# Altium footprint library Module.PcbLib: 57 footprints (part 3 of 4)
Each footprint in its own frame and in the unit in brackets; x right, y up, seen from the top. Pads: shape width x height; smd on the part's side, far side on the other; paste and mask are expansions set on the pad; w line width, h text height; cw(c..) or ccw(c..) is an arc to the next point about the centre after c.
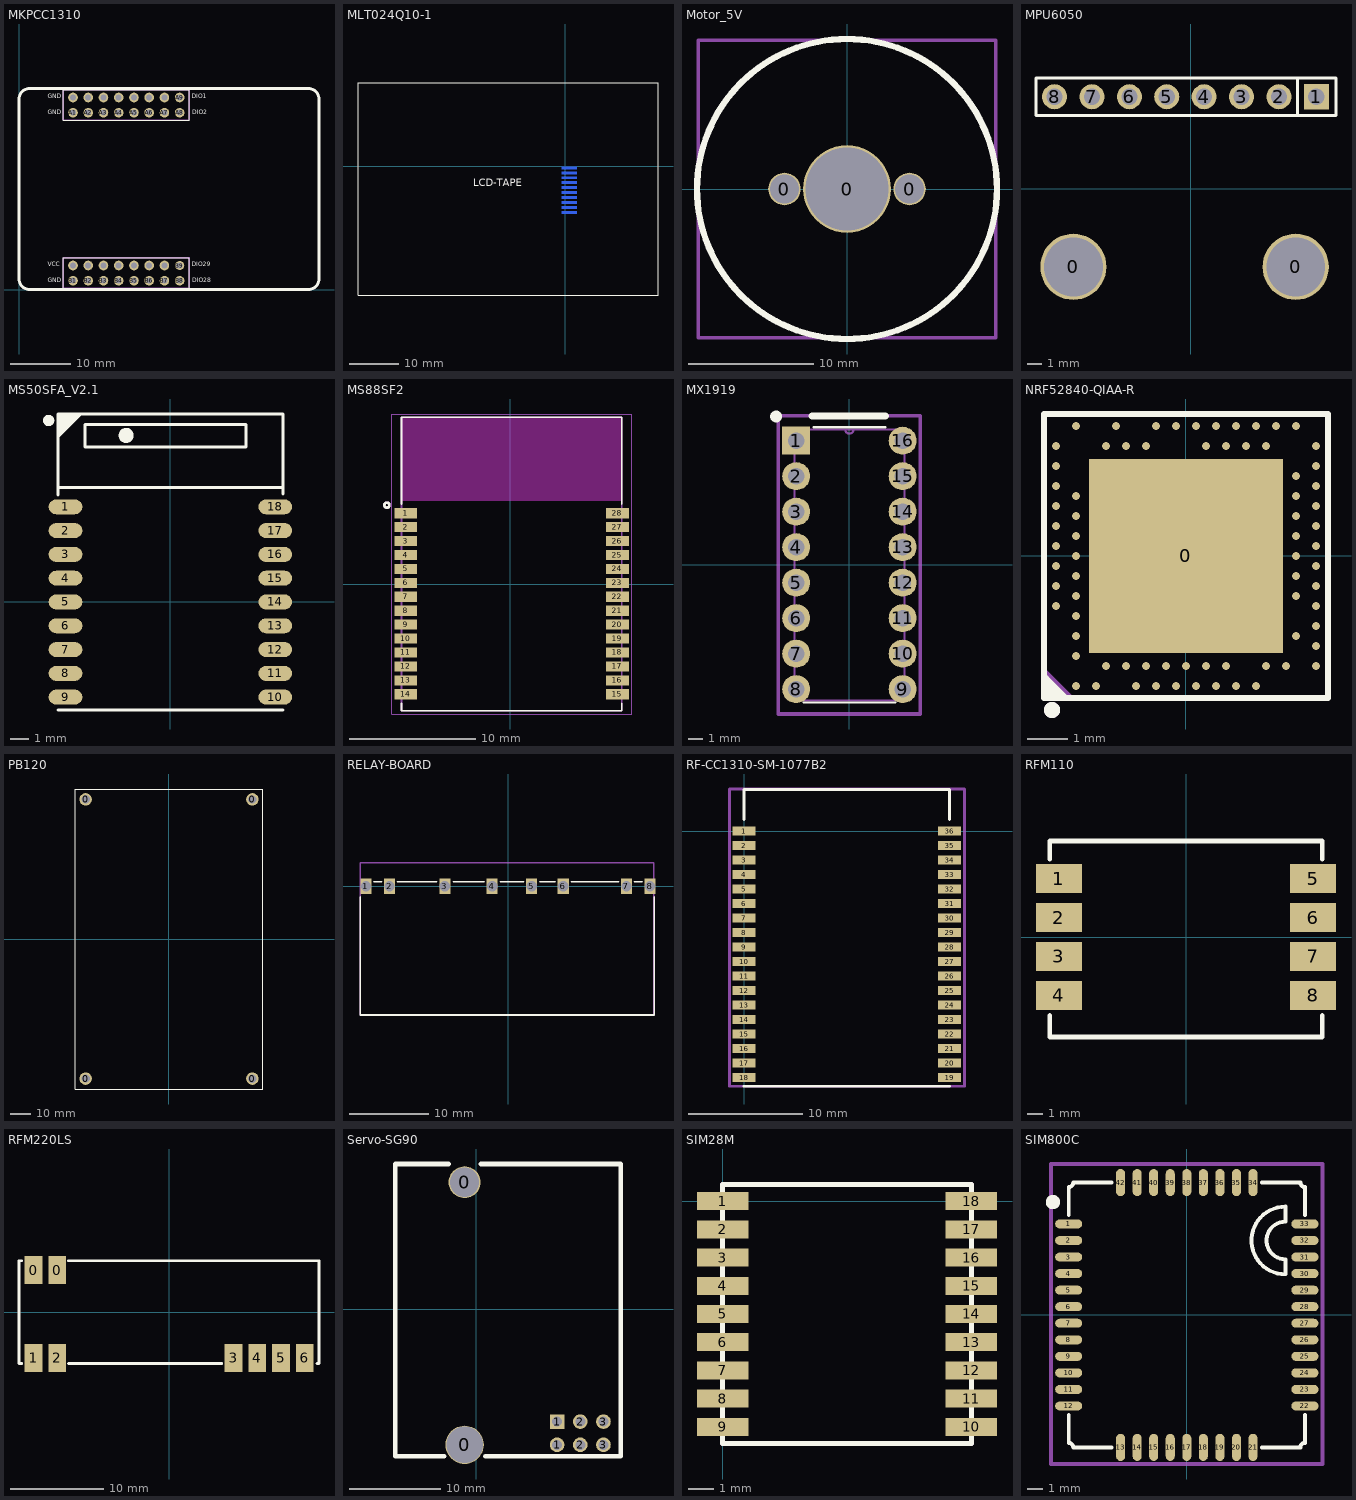
[diagram p2: the footprints below, top view; thin cyan lines are the x and y axes]

## MKPCC1310 [mm]
pads (32):
  round 1.6 hole 1: A1(9,29.46) A2(11.54,29.46) A3(14.08,29.46) A4(16.62,29.46) A5(19.16,29.46) A6(21.7,29.46) A7(24.24,29.46) A8(26.78,29.46) A9(26.78,32) A10(24.24,32) A11(21.7,32) A12(19.16,32) A13(16.62,32) A14(14.08,32) A15(11.54,32) A16(9,32) B1(9,1.46) B2(11.54,1.46) B3(14.08,1.46) B4(16.62,1.46) B5(19.16,1.46) B6(21.7,1.46) B7(24.24,1.46) B8(26.78,1.46) B10(24.24,4) B11(21.7,4) B12(19.16,4) B13(16.62,4) B14(14.08,4) B15(11.54,4) B16(9,4)
  round 1.524 hole 1.016: B9(26.78,4)
Top Overlay:
  lines w0.2: 7.39,0.19 28.39,0.19 28.39,5.27 12.81,5.27 7.39,5.27 7.39,0.19 ; 7.39,28.19 28.39,28.19 28.39,33.27 12.81,33.27 7.39,33.27 7.39,28.19
  lines w0.5: 0,1.75 ccw(c1.75,1.75) 1.75,0 48.25,0 ccw(c48.25,1.75) 50,1.75 50,31.75 ccw(c48.25,31.75) 48.25,33.5 1.75,33.5 ccw(c1.75,31.75) 0,31.75 0,1.75
  text "DIO1" at 28.8,31.6 h1.2
  text "DIO2" at 28.9,29 h1.2
  text "GND" at 4.8,1 h1.2
  text "VCC" at 4.8,3.6 h1.2
  text "DIO28" at 28.9,1 h1.2
  text "DIO29" at 28.8,3.6 h1.2
  text "GND" at 4.8,31.6 h1.2
  text "GND" at 4.8,29 h1.2
Mechanical 13:
  lines w0.254: 7.39,0.19 28.39,0.19 28.39,5.27 7.39,5.27 7.39,0.19 ; 7.39,28.19 28.39,28.19 28.39,33.27 7.39,33.27 7.39,28.19
  text ".Designator" at 15.5,19.3 h1.5
Mechanical 15:
  lines w0.254: 7.39,0.19 28.39,0.19 28.39,5.27 7.39,5.27 7.39,0.19 ; 7.39,28.19 28.39,28.19 28.39,33.27 7.39,33.27 7.39,28.19
  text ".Comment" at 15.5,19.3 h1.5
3D body "ESW-108-12-G-D.stp": height 11.01, standoff -2.33, extent 7.476,0.19 28.304,5.27
3D body "ESW-108-12-G-D.stp": height 11.01, standoff -2.33, extent 7.476,28.19 28.304,33.27
3D body "Module_RF_CC1310_433MHz_v2.1.step": height 19.45, standoff 5.13, extent 0,0 50,33.5

## MLT024Q10-1 [mm]
pads (10):
  rect 3x0.5 smd far side: 1(0.849,-0.312) 2(0.849,-1.312) 3(0.849,-2.312) 4(0.849,-3.312) 5(0.849,-4.312) 6(0.849,-5.312) 7(0.849,-6.312) 8(0.849,-7.312) 9(0.849,-8.312) 10(0.849,-9.312)
Top Overlay:
  lines w0.2: -41.648,-25.936 -41.648,16.784 18.692,16.784 18.692,-25.936 -41.648,-25.936
  text "LCD-TAPE" at -18.478,-4.548 h2.5
3D body "Màn hình 4 (1).STEP": height 2.25, standoff -3.3, extent -41.648,-26.136 18.692,16.584

## Motor_5V [mm]
pads (3):
  round 2.6 hole 2.3: 0(-5,0) 0(5,0)
  round 7 hole 6.6: 0(0,0)
Top Overlay:
  lines w0.5: -12,0 cw(c0,0) 0,12 cw(c0,0) 12,0 cw(c0,0) 0,-12 cw(c0,0) -12,0
Mechanical 13:
  lines w0.254: -11.9,-11.9 -11.9,11.9 11.9,11.9 11.9,-11.9 -11.9,-11.9
Mechanical 15:
  lines w0.254: -11.9,-11.9 -11.9,11.9 11.9,11.9 11.9,-11.9 -11.9,-11.9
3D body "Motor_3D.step": height 0.25, standoff -0.41, extent -12.001,-12.001 12.001,12.001
3D body "User Library-3v 5240rpm motor assem.STEP": height 5.43, standoff -37.57, extent -11.9,-11.9 11.9,11.9

## MPU6050 [mm]
pads (10):
  round 4.5 hole 4: 0(-7.96,-5.3) 0(7.14,-5.3)
  rect 1.7x1.7 hole 1.1: 1(8.54,6.25)
  round 1.7 hole 1.1: 2(6,6.25) 3(3.46,6.25) 4(0.92,6.25) 5(-1.62,6.25) 6(-4.16,6.25) 7(-6.7,6.25) 8(-9.24,6.25)
Top Overlay:
  lines w0.2: 7.27,4.98 7.27,7.52 ; -10.5,4.98 -10.5,7.52 9.875,7.52 9.875,4.98 -10.5,4.98
3D body "MPU6050 With Mounting Hardware.step": height 15.07, standoff -2.77, extent -10.504,-7.75 9.875,7.5

## MS50SFA_V2.1 [mm] "MS50SFA"
pads (18):
  oval 1.8x0.8 smd: 1(-5.6,5.08) 2(-5.6,3.81) 3(-5.6,2.54) 4(-5.6,1.27) 5(-5.6,0) 6(-5.6,-1.27) 7(-5.6,-2.54) 8(-5.6,-3.81) 9(-5.6,-5.08) 10(5.6,-5.08) 11(5.6,-3.81) 12(5.6,-2.54) 13(5.6,-1.27) 14(5.6,0) 15(5.6,1.27) 16(5.6,2.54) 17(5.6,3.81) 18(5.6,5.08)
Top Overlay:
  circle w0.4: c-2.36,8.89 r0.2
  circle w0.3: c-6.5,9.69 r0.15
  region: -5.995,9.255 -5.995,10.035 -5.96,10.035 -5.935,10.035 -4.695,10.035 -5.995,8.735
  lines w0.16: -6,-5.776 6,-5.776 ; -6,5.704 -6,10.024 6,10.024 6,5.774 ; -6,6.124 6,6.124 ; 4.03,8.274 -4.55,8.274 -4.55,9.474 4.03,9.474 ; 4.04,8.274 4.04,9.474
Mechanical 15:
  text "Chip Antenna" at -4.16,8.58 h0.5
3D body "MS50SFA_PCB_V2.1.step": height 2.03, standoff 0.01, extent -5.99,-5.86 6.01,10

## MS88SF2 [mm]
pads (28):
  rect 1.8x0.8 smd: 1(-8.26,5.61) 2(-8.26,4.51) 3(-8.26,3.41) 4(-8.26,2.31) 5(-8.26,1.21) 6(-8.26,0.11) 7(-8.26,-0.99) 8(-8.26,-2.09) 9(-8.26,-3.19) 10(-8.26,-4.29) 11(-8.26,-5.39) 12(-8.26,-6.49) 13(-8.26,-7.59) 14(-8.26,-8.69) 15(8.46,-8.69) 16(8.46,-7.59) 17(8.46,-6.49) 18(8.46,-5.39) 19(8.46,-4.29) 20(8.46,-3.19) 21(8.46,-2.09) 22(8.46,-0.99) 23(8.46,0.11) 24(8.46,1.21) 25(8.46,2.31) 26(8.46,3.41) 27(8.46,4.51) 28(8.46,5.61)
Top Overlay:
  circle w0.2: c-9.75,6.25 r0.2
  lines w0.127: -8.6,-9.395 -8.6,-10 8.8,-10 8.8,-9.395 ; -8.6,6.315 -8.6,13.2 8.8,13.2 8.8,6.315
Keep-Out Layer:
  region: 8.8,6.6 -8.6,6.6 -8.6,13.2 8.8,13.2
  region: 8.8,6.6 -8.6,6.6 -8.6,13.2 8.8,13.2
Mechanical 13:
  circle w0.2: c-9.75,6.25 r0.2
  lines w0.127: -8.6,-10 -8.6,13.2 8.8,13.2 8.8,-10 -8.6,-10
Mechanical 15:
  lines w0.05: -9.385,-10.25 -9.385,13.45 9.585,13.45 9.585,-10.25 -9.385,-10.25
3D body "step_temp.STEP": height 1.65, standoff -0.69, extent -8.599,-9.965 8.799,13.03

## MX1919 [mm]
pads (16):
  rect 2x2 hole 1.2: 1(-3.81,8.89)
  round 2 hole 1.2: 2(-3.81,6.35) 3(-3.81,3.81) 4(-3.81,1.27) 5(-3.81,-1.27) 6(-3.81,-3.81) 7(-3.81,-6.35) 8(-3.81,-8.89) 9(3.81,-8.89) 10(3.81,-6.35) 11(3.81,-3.81) 12(3.81,-1.27) 13(3.81,1.27) 14(3.81,3.81) 15(3.81,6.35) 16(3.81,8.89)
Top Overlay:
  circle w0.5: c-5.25,10.625 r0.177
  lines w0.152: -3.277,-9.855 3.277,-9.855 ; -2.565,9.855 2.591,9.855
  lines w0.508: -2.667,10.668 2.565,10.668
Mechanical 13:
  lines w0.152: -0.305,9.703 ccw(c0,9.703) 0.305,9.703 ; -0.305,9.703 0.305,9.703 ; -0.305,9.703 -3.937,9.703 -3.937,-9.703 3.937,-9.703 3.937,9.703 0.305,9.703 ; -4.216,-9.296 -3.937,-9.296 -3.937,-8.484 -4.216,-8.484 -4.216,-9.296 ; -4.216,-6.756 -4.216,-5.944 -3.937,-5.944 -3.937,-6.756 -4.216,-6.756 ; -4.216,-4.216 -4.216,-3.404 -3.937,-3.404 -3.937,-4.216 -4.216,-4.216 ; -4.216,-1.676 -3.937,-1.676 -3.937,-0.864 -4.216,-0.864 -4.216,-1.676 ; -4.216,0.864 -3.937,0.864 -3.937,1.676 -4.216,1.676 -4.216,0.864 ; -4.216,3.404 -3.937,3.404 -3.937,4.216 -4.216,4.216 -4.216,3.404 ; -4.216,5.944 -4.216,6.756 -3.937,6.756 -3.937,5.944 -4.216,5.944 ; -4.216,8.484 -3.937,8.484 -3.937,9.296 -4.216,9.296 -4.216,8.484 ; 3.937,-9.296 3.937,-8.484 4.216,-8.484 4.216,-9.296 3.937,-9.296 ; 3.937,-6.756 3.937,-5.944 4.216,-5.944 4.216,-6.756 3.937,-6.756 ; 3.937,-4.216 4.216,-4.216 4.216,-3.404 3.937,-3.404 3.937,-4.216 ; 3.937,-1.676 3.937,-0.864 4.216,-0.864 4.216,-1.676 3.937,-1.676 ; 3.937,0.864 4.216,0.864 4.216,1.676 3.937,1.676 3.937,0.864 ; 3.937,3.404 4.216,3.404 4.216,4.216 3.937,4.216 3.937,3.404 ; 3.937,5.944 4.216,5.944 4.216,6.756 3.937,6.756 3.937,5.944 ; 3.937,8.484 3.937,9.296 4.216,9.296 4.216,8.484 3.937,8.484
Mechanical 15:
  lines w0.254: -5.08,-10.668 -5.08,10.668 5.08,10.668 5.08,-10.668 -5.08,-10.668
3D body "step_temp.STEP": height 9.13, standoff 0.75, extent -4.655,-10.668 4.655,10.668
3D body "16 pin IC socket.SLDPRT": height 5.09, standoff -3.54, extent -5.08,-10.16 5.08,10.16

## NRF52840-QIAA-R [mm]
pads (74):
  rect 4.85x4.85 smd paste-100 mask+0.051: 0(0,0)
  round 0.2 smd paste-100 mask+0.051: A8(-3.25,-1.25) A10(-3.25,-0.75) A12(-3.25,-0.25) A14(-3.25,0.25) A16(-3.25,0.75) A18(-3.25,1.25) A20(-3.25,1.75) A22(-3.25,2.25) A23(-3.25,2.75) AA24(2.25,3.25) AB2(2.5,-2.75) AC5(2.75,-2) AC9(2.75,-1) AC11(2.75,-0.5) AC13(2.75,0) AC15(2.75,0.5) AC17(2.75,1) AC19(2.75,1.5) AC21(2.75,2) AC24(2.75,3.25) AD2(3.25,-2.75) AD4(3.25,-2.25) AD6(3.25,-1.75) AD8(3.25,-1.25) AD10(3.25,-0.75) AD12(3.25,-0.25) AD14(3.25,0.25) AD16(3.25,0.75) AD18(3.25,1.25) AD20(3.25,1.75) AD22(3.25,2.25) AD23(3.25,2.75) B1(-2.75,-3.25) B3(-2.75,-2.5) B5(-2.75,-2) B7(-2.75,-1.5) B9(-2.75,-1) B11(-2.75,-0.5) B13(-2.75,0) B15(-2.75,0.5) B17(-2.75,1) B19(-2.75,1.5) B24(-2.75,3.25) C1(-2.25,-3.25) D2(-2,-2.75) D23(-2,2.75) E24(-1.75,3.25) F2(-1.5,-2.75) F23(-1.5,2.75) G1(-1.25,-3.25) H2(-1,-2.75) H23(-1,2.75) J1(-0.75,-3.25) J24(-0.75,3.25) K2(-0.5,-2.75) L1(-0.25,-3.25) L24(-0.25,3.25) M2(0,-2.75) N1(0.25,-3.25) N24(0.25,3.25) P2(0.5,-2.75) P23(0.5,2.75) R1(0.75,-3.25) R24(0.75,3.25) T2(1,-2.75) T23(1,2.75) U1(1.25,-3.25) U24(1.25,3.25) V23(1.5,2.75) W1(1.75,-3.25) W24(1.75,3.25) Y2(2,-2.75) Y23(2,2.75)
Top Overlay:
  circle w0.2: c-3.35,-3.85 r0.1
  region: -3.55,-3.55 -3.55,-3 -3,-3.55
  lines w0.152: -3.5,-3.05 -3,-3.55 -2.991,-3.55 ; -3.55,-3.55 3.55,-3.55 3.55,3.55 -3.55,3.55 -3.55,-3.55
Top Paste:
  drawing of 74 lines, arcs and shapes, not listed
Mechanical 15:
  circle w0.2: c-3.35,-3.85 r0.1
  region: -3.55,-2.8 -3.55,-3.55 -2.8,-3.55

## PB120 [mm]
pads (4):
  round 6 hole 4: 0(-40,-67) 0(-40,67) 0(40,-67) 0(40,67)
Top Overlay:
  lines w0.5: -45,-72 45,-72 45,72 -45,72 -45,-72

## RELAY-BOARD [mm]
pads (8):
  rect 1.4x2 hole 1.3 square: 1(-18,0) 2(-15,0) 3(-8,0) 4(-2,0) 5(3,0) 6(7,0) 7(15,0) 8(18,0)
Top Overlay:
  lines w0.2: -18.7,-1.3 -18.7,-16.3 18.5,-16.3 18.5,-1.3 ; -17,0.6 -16,0.6 ; -14,0.6 -9,0.6 ; -6.9,0.6 -3,0.6 ; -1,0.6 2,0.6 ; 4,0.6 6,0.6 ; 8,0.6 14,0.6 ; 16,0.6 17,0.6
Mechanical 1:
  lines w0.2: -18.7,-16.324 18.458,-16.324 18.458,2.976 -18.7,2.976 -18.7,-16.324
Mechanical 13:
  lines w0.2: -18.7,-16.324 -18.7,2.976 18.458,2.976 18.458,-16.324 -18.7,-16.324
  text ".Designator" at -3.2,-8 h1.5
Mechanical 15:
  lines w0.2: -18.7,-16.324 -18.7,2.976 18.458,2.976 18.458,-16.324 -18.7,-16.324
  text ".Comment" at -3.2,-8 h1.5
3D body "PCB.step": height 10.99, standoff -1.8, extent -18.579,-16.3 18.579,3

## RF-CC1310-SM-1077B2 [mm]
pads (36):
  rect 2x0.8 smd: 1(0,0) 2(0,-1.27) 3(0,-2.54) 4(0,-3.81) 5(0,-5.08) 6(0,-6.35) 7(0,-7.62) 8(0,-8.89) 9(0,-10.16) 10(0,-11.43) 11(0,-12.7) 12(0,-13.97) 13(0,-15.24) 14(0,-16.51) 15(0,-17.78) 16(0,-19.05) 17(0,-20.32) 18(0,-21.59) 19(18,-21.59) 20(18,-20.32) 21(18,-19.05) 22(18,-17.78) 23(18,-16.51) 24(18,-15.24) 25(18,-13.97) 26(18,-12.7) 27(18,-11.43) 28(18,-10.16) 29(18,-8.89) 30(18,-7.62) 31(18,-6.35) 32(18,-5.08) 33(18,-3.81) 34(18,-2.54) 35(18,-1.27) 36(18,0)
Top Overlay:
  lines w0.254: 0,-22.35 18,-22.35 ; 0,1 0,3.65 18,3.65 18,1
Mechanical 13:
  lines w0.254: -1.27,-22.352 -1.27,3.683 19.304,3.683 19.304,-22.352 -1.27,-22.352
  text ".Designator" at 9.525,-19.812 h4.5
Mechanical 15:
  lines w0.254: -1.27,-22.352 19.304,-22.352 19.304,3.683 -1.27,3.683 -1.27,-22.352
  text ".Comment" at 9.525,-19.812 h4.5
3D body: height 2, standoff 0, extent 0,-22.352 18.034,3.683

## RFM110 [mm]
pads (8):
  rect 3x1.9 smd: 1(-8.3,3.84) 2(-8.3,1.3) 3(-8.3,-1.24) 4(-8.3,-3.78) 5(8.3,3.84) 6(8.3,1.3) 7(8.3,-1.24) 8(8.3,-3.78)
Top Overlay:
  lines w0.3: -8.9,-5.1 -8.9,-6.5 8.9,-6.5 8.9,-5.1 ; -8.9,5.1 -8.9,6.3 8.9,6.3 8.9,5.1

## RFM220LS [mm]
pads (8):
  rect 1.9x3 smd: 0(-14.54,4.5) 0(-12,4.5) 1(-14.54,-4.9) 2(-12,-4.9) 3(6.86,-4.9) 4(9.4,-4.9) 5(11.94,-4.9) 6(14.48,-4.9)
Top Overlay:
  lines w0.3: -15.8,-5.5 -16.1,-5.5 -16.1,5.5 -15.8,5.5 ; -10.8,-5.5 5.6,-5.5 ; -10.8,5.5 16,5.5 16,-5.5 15.8,-5.5

## Servo-SG90 [mm]
pads (8):
  round 4.2 hole 4: 0(-1.284,-14.838)
  round 3.5 hole 3.2: 0(-1.284,13.9)
  round 1.6 hole 1.1: 1(8.837,-14.838) 2(11.377,-14.838) 2(11.377,-12.298) 3(13.917,-14.838) 3(13.917,-12.298)
  rect 1.6x1.6 hole 1.1: 1(8.837,-12.298)
Top Overlay:
  lines w0.5: -3.5,-16.105 -8.875,-16.105 -8.875,15.895 -3,15.895 ; 0.5,15.895 15.808,15.895 15.808,-16.105 1,-16.104
Bottom Overlay:
  lines w0.2: 7.609,-10.332 8.033,-10.756 ; 8.414,-8.233 8.414,-2.839 8.837,-2.416 9.26,-2.839 9.26,-8.258 ; 10.954,-8.233 10.954,-2.839 11.377,-2.416 11.8,-2.839 11.8,-8.233 ; 13.494,-8.233 13.494,-2.839 13.917,-2.416 14.34,-2.839 14.34,-8.258 ; 7.567,-10.798 7.567,-8.258 15.187,-8.258 15.187,-10.798 7.567,-10.798
3D body "servo motor.STEP": height 33.8, standoff 0.85, extent -18.358,-16.104 15.808,15.895
3D body "61300621021.stp": height 5.09, standoff -2.99, extent 7.567,-15.219 15.187,-2.319

## SIM28M [mm]
pads (18):
  rect 2x0.7 smd: 1(0,0) 2(0,-1.1) 3(0,-2.2) 4(0,-3.3) 5(0,-4.4) 6(0,-5.5) 7(0,-6.6) 8(0,-7.7) 9(0,-8.8) 10(9.7,-8.8) 11(9.7,-7.7) 12(9.7,-6.6) 13(9.7,-5.5) 14(9.7,-4.4) 15(9.7,-3.3) 16(9.7,-2.2) 17(9.7,-1.1) 18(9.7,0)
Top Overlay:
  lines w0.2: 0,-9.45 0,0.65 9.7,0.65 9.7,-9.45 0,-9.45
Mechanical 13:
  lines w0.2: 0,-9.45 9.7,-9.45 9.7,0.65 0,0.65 0,-9.45
  text ".Designator" at 5.754,-8.758 h2.5
Mechanical 15:
  lines w0.2: 0,-9.45 9.7,-9.45 9.7,0.65 0,0.65 0,-9.45
  text ".Comment" at 5.754,-8.758 h2.5
3D body "User Library-SIM28M.STEP": height 2.56, standoff -0.01, extent 0,-9.45 9.72,0.65

## SIM800C [mm]
pads (42):
  oval 1.8x0.6 smd: 1(-7.85,6.05) 2(-7.85,4.95) 3(-7.85,3.85) 4(-7.85,2.75) 5(-7.85,1.65) 6(-7.85,0.55) 7(-7.85,-0.55) 8(-7.85,-1.65) 9(-7.85,-2.75) 10(-7.85,-3.85) 11(-7.85,-4.95) 12(-7.85,-6.05) 22(7.85,-6.05) 23(7.85,-4.95) 24(7.85,-3.85) 25(7.85,-2.75) 26(7.85,-1.65) 27(7.85,-0.55) 28(7.85,0.55) 29(7.85,1.65) 30(7.85,2.75) 31(7.85,3.85) 32(7.85,4.95) 33(7.85,6.05)
  oval 0.6x1.8 smd: 13(-4.4,-8.8) 14(-3.3,-8.8) 15(-2.2,-8.8) 16(-1.1,-8.8) 17(0,-8.8) 18(1.1,-8.8) 19(2.2,-8.8) 20(3.3,-8.8) 21(4.4,-8.8) 34(4.4,8.8) 35(3.3,8.8) 36(2.2,8.8) 37(1.1,8.8) 38(0,8.8) 39(-1.1,8.8) 40(-2.2,8.8) 41(-3.3,8.8) 42(-4.4,8.8)
Top Overlay:
  circle w0.5: c-8.9,7.5 r0.224
  lines w0.254: -7.85,-6.65 -7.85,-8.5 cw(c-7.85,-8.8) -7.55,-8.8 -5,-8.8 ; -7.85,6.65 -7.85,8.5 ccw(c-7.85,8.8) -7.55,8.8 -5,8.8 ; 5,-8.8 7.55,-8.8 cw(c7.85,-8.8) 7.85,-8.5 7.85,-6.65 ; 5,8.8 7.55,8.8 ccw(c7.85,8.8) 7.85,8.5 7.85,6.65 ; 6.55,2.7 cw(c6.55,4.95) 6.55,7.2 6.55,6.2 ccw(c6.55,4.95) 6.55,3.7 6.55,2.7
Mechanical 13:
  lines w0.254: -9.017,-9.906 9.017,-9.906 9.017,10.033 -9.017,10.033 -9.017,-9.906
  text ".Designator" at 0.4,-8.1 h3
Mechanical 15:
  lines w0.254: -9.017,-9.906 -9.017,10.033 9.017,10.033 9.017,-9.906 -9.017,-9.906
  text ".Comment" at 0.4,-8.1 h3
3D body "User Library-SIM800C-1.STEP": height 2.37, standoff 0.03, extent -7.85,-8.8 7.85,8.8